# Altium footprint library TarabusLibrary.PcbLib: 591 footprints (part 26 of 37)
Each footprint in its own frame and in the unit in brackets; x right, y up, seen from the top. Pads: shape width x height; smd on the part's side, far side on the other; paste and mask are expansions set on the pad; w line width, h text height; cw(c..) or ccw(c..) is an arc to the next point about the centre after c.
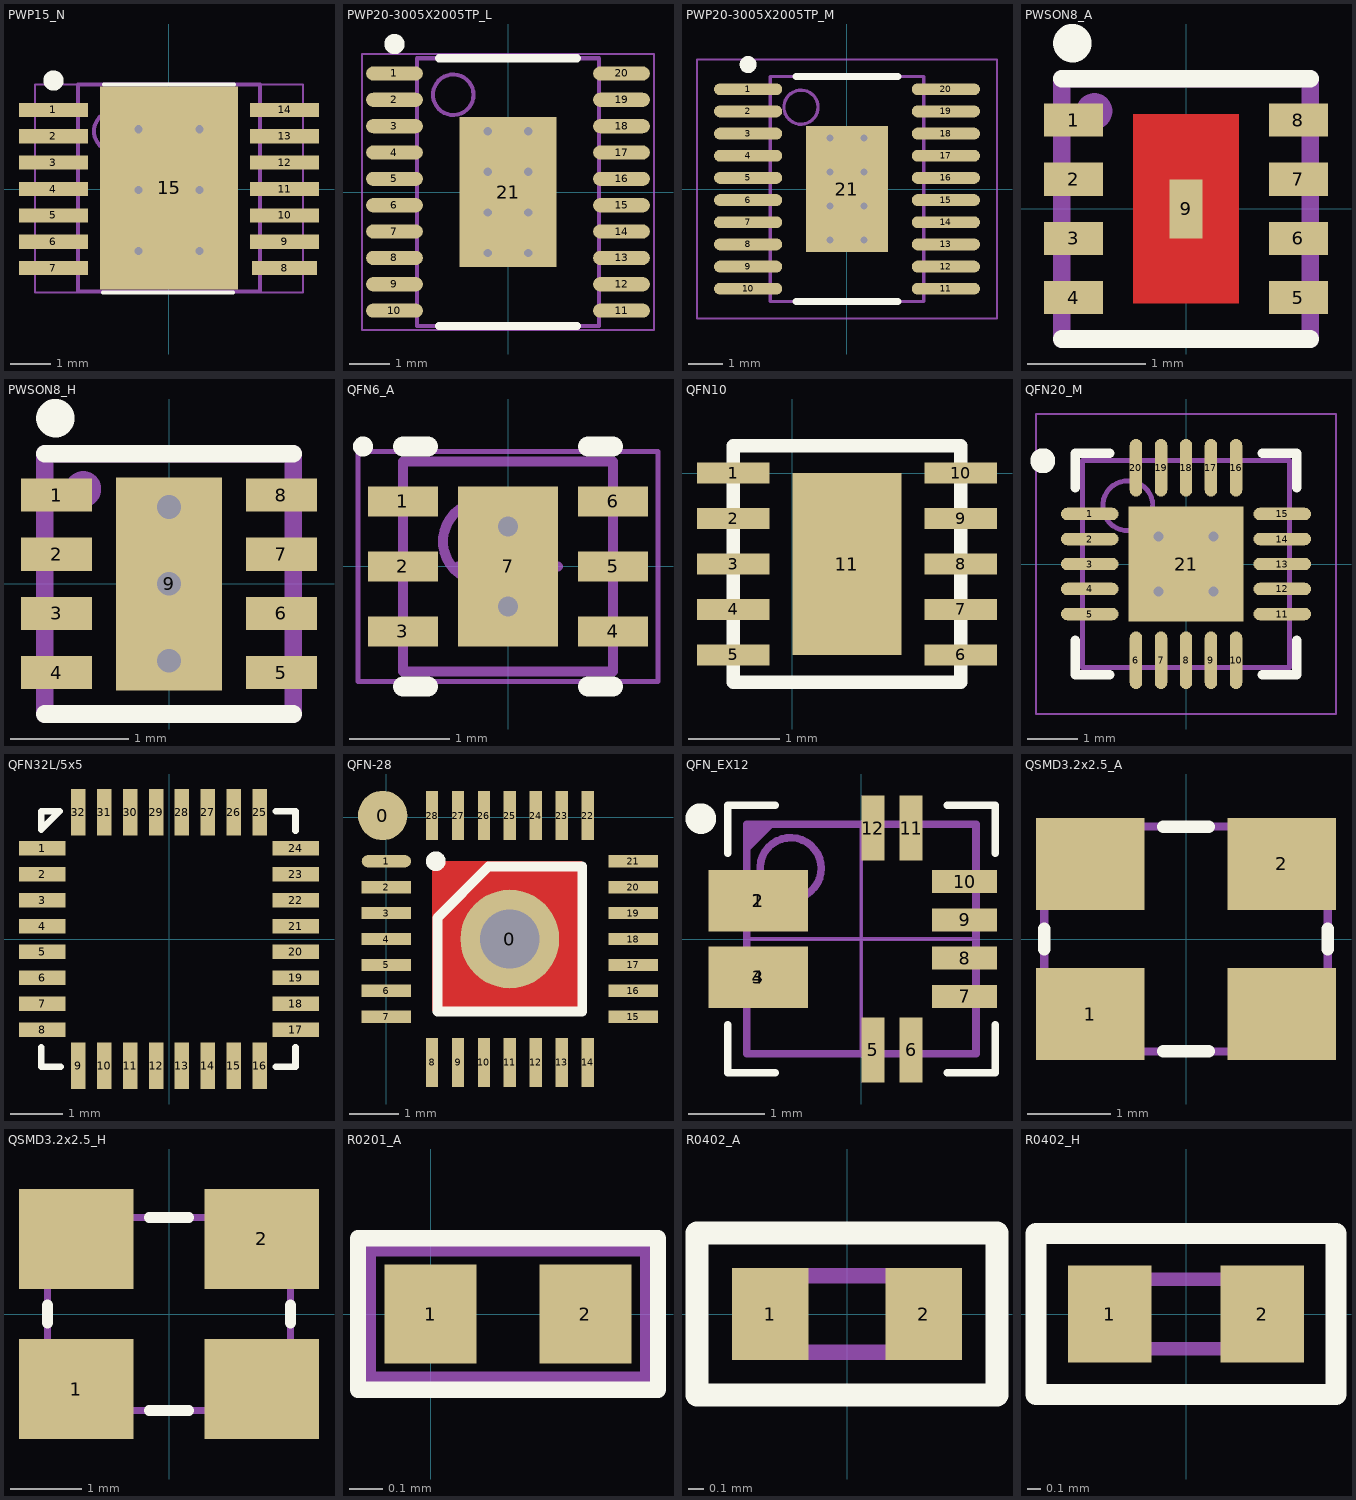
[diagram p25: the footprints below, top view; thin cyan lines are the x and y axes]

## PWP15_N [mm] "TSOP, 20-Leads, Body 6.5x4.4mm, Pitch 0.65mm, Thermal Pad 3.7x2.4 mm, IPC Medium Density"
height 1.2
pads (15):
  rect 1.7x0.35 smd: 1(-2.85,1.95) 2(-2.85,1.3) 3(-2.85,0.65) 4(-2.85,0) 5(-2.85,-0.65) 6(-2.85,-1.3) 7(-2.85,-1.95) 9(2.85,-1.3) 10(2.85,-0.65) 11(2.85,0) 12(2.85,0.65) 13(2.85,1.3) 14(2.85,1.95)
  rect 1.6x0.35 smd: 8(2.85,-1.95)
  rect 3.4x5 smd: 15(0,0.025)
via -0.75,1.475 diameter 0.5 hole 0.2
via -0.75,-0.025 diameter 0.5 hole 0.2
via -0.75,-1.525 diameter 0.5 hole 0.2
via 0.75,-1.525 diameter 0.5 hole 0.2
via 0.75,-0.025 diameter 0.5 hole 0.2
via 0.75,1.475 diameter 0.5 hole 0.2
Top Overlay:
  circle w0.25: c-2.85,2.675 r0.125
  lines w0.1: -1.625,-2.55 1.575,-2.55 ; -1.6,2.575 1.6,2.575
Mechanical 7:
  lines w0.05: -3.3,2.55 -3.3,-2.55 3.3,-2.55 3.3,2.55 ; -3.3,2.575 3.3,2.575
Mechanical 9:
  circle w0.1: c-1.35,1.425 r0.5
  lines w0.1: -2.25,-2.525 -2.25,2.575 2.25,2.575 2.25,-2.525 -2.25,-2.525
3D body: height 1.2, standoff 0.05, extent -2.25,-2.55 2.25,2.325

## PWP20-3005X2005TP_L [mm] "TSOP, 20-Leads, Body 6.5x4.4mm, Pitch 0.65mm, Thermal Pad 3.7x2.4 mm, IPC High Density"
height 1.2
pads (21):
  oval 1.4x0.35 smd: 1(-2.8,2.925) 2(-2.8,2.275) 3(-2.8,1.625) 4(-2.8,0.975) 5(-2.8,0.325) 6(-2.8,-0.325) 7(-2.8,-0.975) 8(-2.8,-1.625) 9(-2.8,-2.275) 10(-2.8,-2.925) 11(2.8,-2.925) 12(2.8,-2.275) 13(2.8,-1.625) 14(2.8,-0.975) 15(2.8,-0.325) 16(2.8,0.325) 17(2.8,0.975) 18(2.8,1.625) 19(2.8,2.275) 20(2.8,2.925)
  rect 2.4x3.7 smd: 21(0,0)
via 0.5,1.5 diameter 0.5 hole 0.2
via 0.5,0.5 diameter 0.5 hole 0.2
via 0.5,-0.5 diameter 0.5 hole 0.2
via 0.5,-1.5 diameter 0.5 hole 0.2
via -0.5,-1.5 diameter 0.5 hole 0.2
via -0.5,-0.5 diameter 0.5 hole 0.2
via -0.5,0.5 diameter 0.5 hole 0.2
via -0.5,1.5 diameter 0.5 hole 0.2
Top Overlay:
  circle w0.25: c-2.8,3.65 r0.125
  lines w0.2: -1.7,-3.3 1.7,-3.3 ; -1.7,3.3 1.7,3.3
Mechanical 13:
  circle w0.1: c-1.35,2.4 r0.5
  lines w0.1: -2.25,-3.3 -2.25,3.3 2.25,3.3 2.25,-3.3 -2.25,-3.3
Mechanical 15:
  lines w0.05: -3.6,-3.4 -3.6,3.4 3.6,3.4 3.6,-3.4 -3.6,-3.4
  lines w0.1: -0.5,0 0.5,0 ; 0,-0.5 0,0.5
3D body: height 1.2, standoff 0.05, extent -2.25,-3.3 2.25,3.3

## PWP20-3005X2005TP_M [mm] "TSOP, 20-Leads, Body 6.5x4.4mm, Pitch 0.65mm, Thermal Pad 3.7x2.4 mm, IPC Low Density"
height 1.2
pads (21):
  oval 2x0.35 smd: 1(-2.9,2.925) 2(-2.9,2.275) 3(-2.9,1.625) 4(-2.9,0.975) 5(-2.9,0.325) 6(-2.9,-0.325) 7(-2.9,-0.975) 8(-2.9,-1.625) 9(-2.9,-2.275) 10(-2.9,-2.925) 11(2.9,-2.925) 12(2.9,-2.275) 13(2.9,-1.625) 14(2.9,-0.975) 15(2.9,-0.325) 16(2.9,0.325) 17(2.9,0.975) 18(2.9,1.625) 19(2.9,2.275) 20(2.9,2.925)
  rect 2.4x3.7 smd: 21(0,0)
via 0.5,1.5 diameter 0.5 hole 0.2
via 0.5,0.5 diameter 0.5 hole 0.2
via 0.5,-0.5 diameter 0.5 hole 0.2
via 0.5,-1.5 diameter 0.5 hole 0.2
via -0.5,-1.5 diameter 0.5 hole 0.2
via -0.5,-0.5 diameter 0.5 hole 0.2
via -0.5,0.5 diameter 0.5 hole 0.2
via -0.5,1.5 diameter 0.5 hole 0.2
Top Overlay:
  circle w0.25: c-2.9,3.65 r0.125
  lines w0.2: -1.5,-3.3 1.5,-3.3 ; -1.5,3.3 1.5,3.3
Mechanical 13:
  circle w0.1: c-1.35,2.4 r0.5
  lines w0.1: -2.25,-3.3 -2.25,3.3 2.25,3.3 2.25,-3.3 -2.25,-3.3
Mechanical 15:
  lines w0.05: -4.4,-3.8 -4.4,3.8 4.4,3.8 4.4,-3.8 -4.4,-3.8
  lines w0.1: -0.5,0 0.5,0 ; 0,-0.5 0,0.5
3D body: height 1.2, standoff 0.05, extent -2.25,-3.3 2.25,3.3

## PWSON8_A [mm]
pads (9):
  rect 0.5x0.28 smd: 1(-0.95,0.75) 2(-0.95,0.25) 3(-0.95,-0.25) 4(-0.95,-0.75) 5(0.95,-0.75) 6(0.95,-0.25) 7(0.95,0.25) 8(0.95,0.75)
  rect 0.28x0.5 smd: 9(0,0)
Top Layer:
  rectangle: -0.45,-0.8 0.45,0.8
Top Overlay:
  circle w0.254: c-0.96,1.4 r0.035
  lines w0.15: -1.05,-1.1 1.05,-1.1 ; -1.05,1.1 1.05,1.1
Mechanical 7:
  circle w0.254: c-0.775,0.825 r0.025
  lines w0.15: -1.05,-1.1 -1.05,1.1 1.05,1.1 1.05,-1.1 -1.05,-1.1
Mechanical 10:
  text ".Designator" at -0.5,2.175 h0.8
  text ".Comment" at -0.475,1.6 h0.6
3D body "PWSON8.STEP": height 0.8, standoff 0, extent -1.025,-1.05 1.075,1.05

## PWSON8_H [mm]
pads (9):
  rect 0.6x0.28 smd: 1(-0.95,0.75) 2(-0.95,0.25) 3(-0.95,-0.25) 4(-0.95,-0.75) 5(0.95,-0.75) 6(0.95,-0.25) 7(0.95,0.25) 8(0.95,0.75)
  rect 0.9x1.8 smd: 9(0,0)
via 0,-0.65 diameter 0.5 hole 0.2
via 0,0.65 diameter 0.5 hole 0.2
via 0,0 diameter 0.5 hole 0.2
Top Overlay:
  circle w0.254: c-0.96,1.4 r0.035
  lines w0.15: -1.05,-1.1 1.05,-1.1 ; -1.05,1.1 1.05,1.1
Mechanical 7:
  circle w0.254: c-0.725,0.8 r0.025
  lines w0.15: -1.05,-1.1 -1.05,1.1 1.05,1.1 1.05,-1.1 -1.05,-1.1
Mechanical 10:
  text ".Designator" at -0.5,2.175 h0.8
  text ".Comment" at -0.475,1.6 h0.6
3D body "PWSON8.STEP": height 0.8, standoff 0, extent -1.05,-1.05 1.05,1.05

## QFN6_A [mm]
pads (7):
  rect 0.7x0.3 smd paste-0.025 mask+0.07: 1(-1.05,0.65) 2(-1.05,0) 3(-1.05,-0.65) 4(1.05,-0.65) 5(1.05,0) 6(1.05,0.65)
  rect 1x1.6 smd paste-0.5 mask+0.07: 7(0,0)
via 0,0.4 diameter 0.5 hole 0.2
via 0,-0.4 diameter 0.5 hole 0.2
Top Overlay:
  circle w0.1: c-1.45,1.2 r0.05
  lines w0.2: -1.05,-1.2 -0.8,-1.2 ; -1.05,1.2 -0.8,1.2 ; 0.8,-1.2 1.05,-1.2 ; 0.8,1.2 1.05,1.2
Top Paste:
  rectangle: -0.4,-0.7 0.4,0.7
Mechanical 13:
  circle w0.1: c-0.25,0.25 r0.4
  lines w0.1: -1.05,-1.05 -1.05,1.05 1.05,1.05 1.05,-1.05 -1.05,-1.05
Mechanical 15:
  lines w0.05: -1.5,-1.15 -1.5,1.15 1.5,1.15 1.5,-1.15 -1.5,-1.15
  lines w0.1: -0.5,0 0.5,0 ; 0,-0.5 0,0.5
3D body: height 0.8, standoff 0, extent -1.05,-1.05 1.05,1.05

## QFN10 [mm]
pads (11):
  rect 0.8x0.23 smd mask+0: 1(-0.65,0) 2(-0.65,-0.5) 3(-0.65,-1) 4(-0.65,-1.5) 5(-0.65,-2) 6(1.85,-2) 7(1.85,-1.5) 8(1.85,-1) 9(1.85,-0.5) 10(1.85,0)
  rect 1.2x2 smd mask+0: 11(0.6,-1)
Top Overlay:
  lines w0.15: -0.65,-2.3 -0.65,0.3 1.85,0.3 1.85,-2.3 -0.65,-2.3
3D body: height 0.8, standoff 0, extent -0.65,-2.3 1.84,0.3

## QFN20_M [mm] "QFN, 20-Leads, Body 4x4mm, Pitch 0.5mm, Thermal Pad 2.3x2.3mm, IPC Low Density"
height 1
pads (21):
  oval 1.15x0.25 smd: 1(-1.925,1) 2(-1.925,0.5) 3(-1.925,0) 4(-1.925,-0.5) 5(-1.925,-1) 11(1.925,-1) 12(1.925,-0.5) 13(1.925,0) 14(1.925,0.5) 15(1.925,1)
  oval 0.25x1.15 smd: 6(-1,-1.925) 7(-0.5,-1.925) 8(0,-1.925) 9(0.5,-1.925) 10(1,-1.925) 16(1,1.925) 17(0.5,1.925) 18(0,1.925) 19(-0.5,1.925) 20(-1,1.925)
  rect 2.3x2.3 smd: 21(0,0)
via -0.55,0.55 diameter 0.5 hole 0.2
via 0.55,0.55 diameter 0.5 hole 0.2
via -0.55,-0.55 diameter 0.5 hole 0.2
via 0.55,-0.55 diameter 0.5 hole 0.2
Top Overlay:
  circle w0.25: c-2.865,2.065 r0.125
  lines w0.2: -2.215,-1.525 -2.215,-2.215 -1.525,-2.215 ; -2.215,1.525 -2.215,2.215 -1.525,2.215 ; 1.525,-2.215 2.215,-2.215 2.215,-1.525 ; 1.525,2.215 2.215,2.215 2.215,1.525
Mechanical 13:
  circle w0.1: c-1.165,1.165 r0.5
  lines w0.1: -2.065,-2.065 -2.065,2.065 2.065,2.065 2.065,-2.065 -2.065,-2.065
Mechanical 15:
  lines w0.05: -3,-3 -3,3 3,3 3,-3 -3,-3
  lines w0.1: -0.5,0 0.5,0 ; 0,-0.5 0,0.5
3D body: height 1, standoff 0, extent -2.065,-2.065 2.065,2.065

## QFN32L/5x5 [mm]
pads (32):
  rect 0.9x0.28 smd: 1(-2.441,1.75) 2(-2.441,1.25) 3(-2.441,0.75) 4(-2.441,0.25) 5(-2.441,-0.25) 6(-2.441,-0.75) 7(-2.441,-1.25) 8(-2.441,-1.75) 17(2.441,-1.75) 18(2.441,-1.25) 19(2.441,-0.75) 20(2.441,-0.25) 21(2.441,0.25) 22(2.441,0.75) 23(2.441,1.25) 24(2.441,1.75)
  rect 0.28x0.9 smd: 9(-1.75,-2.441) 10(-1.25,-2.441) 11(-0.75,-2.441) 12(-0.25,-2.441) 13(0.25,-2.441) 14(0.75,-2.441) 15(1.25,-2.441) 16(1.75,-2.441) 25(1.75,2.441) 26(1.25,2.441) 27(0.75,2.441) 28(0.25,2.441) 29(-0.25,2.441) 30(-0.75,2.441) 31(-1.25,2.441) 32(-1.75,2.441)
Top Overlay:
  lines w0.127: -2.464,-2.083 -2.464,-2.464 -2.083,-2.464 ; 2.057,-2.464 2.438,-2.464 2.438,-2.083 ; 2.057,2.464 2.438,2.464 2.438,2.083 ; -2.464,2.111 -2.464,2.464 -2.111,2.464 -2.464,2.111

## QFN-28 [mm]
pads (30):
  round 1 smd: 0(-0.075,0.036)
  round 2 hole 1.2 mask+0: 0(2.5,-2.464)
  oval 1x0.25 smd: 1(0,-0.889)
  rect 1x0.25 smd: 2(0,-1.414) 3(0,-1.939) 4(0,-2.464) 5(0,-2.989) 6(0,-3.514) 7(0,-4.039) 15(5,-4.039) 16(5,-3.514) 17(5,-2.989) 18(5,-2.464) 19(5,-1.939) 20(5,-1.414) 21(5,-0.889)
  rect 0.25x1 smd: 8(0.925,-4.964) 9(1.45,-4.964) 10(1.975,-4.964) 11(2.5,-4.964) 12(3.025,-4.964) 13(3.55,-4.964) 14(4.075,-4.964) 22(4.075,0.036) 23(3.55,0.036) 24(3.025,0.036) 25(2.5,0.036) 26(1.975,0.036) 27(1.45,0.036) 28(0.925,0.036)
Top Layer:
  rectangle: 0.925,-3.929 3.965,-0.889
Top Overlay:
  circle w0.2: c1,-0.889 r0.1
  lines w0.2: 1.035,-3.929 1.035,-2.034 2.07,-0.999 3.965,-0.999 3.965,-3.929 1.035,-3.929

## QFN_EX12 [mm] "QFN, 12-Leads, Body 3x3mm, Pitch 0.5mm"
height 0.4
pads (12):
  rect 1.3x0.8 smd mask+0.075: 1(-1.35,0.5) 2(-1.35,0.5) 3(-1.35,-0.5) 4(-1.35,-0.5)
  rect 0.3x0.85 smd mask+0.075: 5(0.15,-1.45) 6(0.65,-1.45) 11(0.65,1.45) 12(0.15,1.45)
  rect 0.85x0.3 smd mask+0.075: 7(1.35,-0.75) 8(1.35,-0.25) 9(1.35,0.25) 10(1.35,0.75)
Top Overlay:
  circle w0.3: c-2.1,1.575 r0.05
  lines w0.1: -1.75,-1.125 -1.75,-1.75 -1.125,-1.75 ; -1.75,1.125 -1.75,1.75 -1.125,1.75 ; 1.125,-1.75 1.75,-1.75 1.75,-1.125 ; 1.125,1.75 1.75,1.75 1.75,1.125
Mechanical 7:
  lines w0.05: -1.488,1.162 -1.161,1.489 ; -1.475,0 1.475,0 ; 0,-1.475 0,1.45 ; -1.5,-1.5 -1.5,1.5 1.5,1.5 1.5,-1.5 -1.5,-1.5
  lines w0.1: -1.47,1.403 -1.4,1.473 ; -1.463,1.258 -1.25,1.472 ; -1.451,1.319 -1.297,1.472
Mechanical 9:
  circle w0.1: c-0.925,0.925 r0.4
  lines w0.1: -1.5,-1.5 1.5,-1.5 1.5,1.5 -1.5,1.5 -1.5,-1.5
Mechanical 10:
  text ".Comment" at -0.925,2.125 h0.6
  text ".Designator" at -1,-2.4 h0.6
3D body: height 0.75, standoff 0.05, extent -1.5,-1.5 1.5,1.5

## QSMD3.2x2.5_A [mm]
height 1.2
pads (4):
  rect 1.3x1.1 smd: 1(-1.15,-0.9) 2(1.15,0.9) ""(-1.15,0.9) ""(1.15,-0.9)
Top Overlay:
  lines w0.15: -1.7,-0.125 -1.7,0.125 ; -0.275,-1.35 0.275,-1.35 ; -0.275,1.35 0.275,1.35 ; 1.7,-0.125 1.7,0.125
Mechanical 7:
  lines w0.1: -1.7,-1.35 -1.7,1.35 1.7,1.35 1.7,-1.35 -1.7,-1.35
Mechanical 10:
  text ".Designator" at -0.85,2.425 h0.8
  text ".Comment" at -0.825,1.85 h0.6
3D body: height 1.2, standoff 0, extent -1.7,-1.35 1.7,1.35

## QSMD3.2x2.5_H [mm]
height 1.2
pads (4):
  rect 1.6x1.4 smd: 1(-1.3,-1.05) 2(1.3,1.05) ""(-1.3,1.05) ""(1.3,-1.05)
Top Overlay:
  lines w0.15: -1.7,-0.125 -1.7,0.125 ; -0.275,-1.35 0.275,-1.35 ; -0.275,1.35 0.275,1.35 ; 1.7,-0.125 1.7,0.125
Mechanical 7:
  lines w0.1: -1.7,-1.35 -1.7,1.35 1.7,1.35 1.7,-1.35 -1.7,-1.35
Mechanical 10:
  text ".Designator" at -0.825,2.75 h0.8
  text ".Comment" at -0.8,2.175 h0.6
3D body: height 1.2, standoff 0, extent -1.7,-1.35 1.7,1.35

## R0201_A [mm]
pads (2):
  rect 0.28x0.3 smd mask+0.05: 1(0,0) 2(0.47,0)
Top Overlay:
  lines w0.05: -0.22,-0.23 -0.22,0.23 0.69,0.23 0.69,-0.23 -0.22,-0.23
Mechanical 7:
  lines w0.05: -0.19,-0.2 0.66,-0.2 0.66,0.2 -0.19,0.2 -0.19,-0.2
Mechanical 10:
  text ".Comment" at -0.08,-1.13 h0.6
  text ".Designator" at -0.08,0.73 h0.8
3D body: height 0.23, standoff 0, extent -0.06,-0.15 0.53,0.15

## R0402_A [mm]
height 0.35
pads (2):
  rect 0.5x0.6 smd: 1(-0.5,0) 2(0.5,0)
Top Overlay:
  lines w0.15: -0.98,-0.53 0.98,-0.53 0.98,0.53 -0.98,0.53 -0.98,-0.53
Mechanical 7:
  lines w0.1: -0.5,-0.25 -0.5,0.25 0.5,0.25 0.5,-0.25 -0.5,-0.25
Mechanical 10:
  text ".Comment" at -0.58,-1.11 h0.6
  text ".Designator" at -0.58,0.75 h0.8
3D body: height 0.35, standoff 0, extent -0.5,-0.25 0.5,0.25

## R0402_H [mm]
height 0.35
pads (2):
  rect 0.6x0.7 smd: 1(-0.55,0) 2(0.55,0)
Top Overlay:
  lines w0.15: -1.08,-0.58 1.08,-0.58 1.08,0.58 -1.08,0.58 -1.08,-0.58
Mechanical 7:
  lines w0.1: -0.5,-0.25 -0.5,0.25 0.5,0.25 0.5,-0.25 -0.5,-0.25
Mechanical 10:
  text ".Comment" at -0.65,-1.15 h0.6
  text ".Designator" at -0.58,0.75 h0.8
3D body: height 0.35, standoff 0, extent -0.5,-0.25 0.5,0.25